# Altium footprint library Cty1.PcbLib: 1378 footprints (part 84 of 87)
Each footprint in its own frame and in the unit in brackets; x right, y up, seen from the top. Pads: shape width x height; smd on the part's side, far side on the other; paste and mask are expansions set on the pad; w line width, h text height; cw(c..) or ccw(c..) is an arc to the next point about the centre after c.
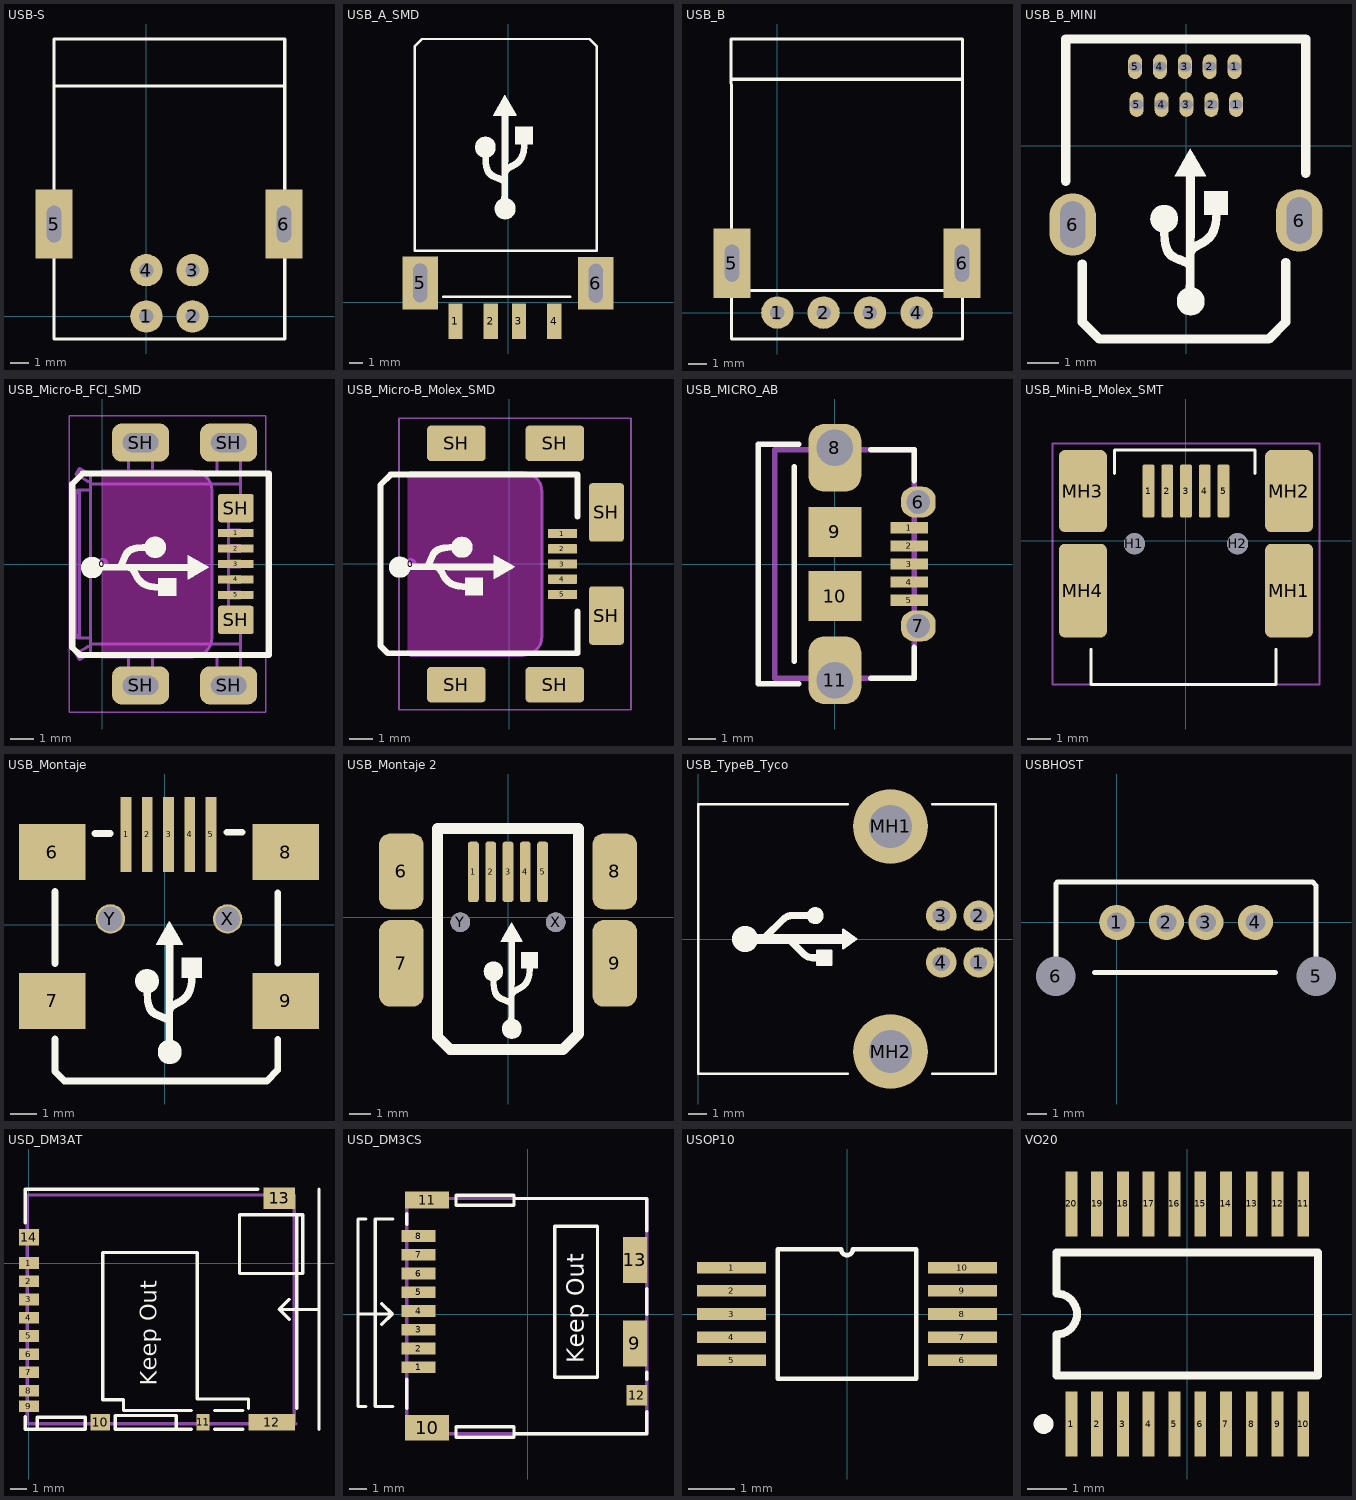
[diagram p83: the footprints below, top view; thin cyan lines are the x and y axes]

## USB-S [mil] "USB B connector, 4pin, For Print"
height 100
pads (6):
  round 70 hole 31: 1(0,0) 2(100,0) 3(100,100) 4(0,100)
  rect 80x150 hole 31 slot 80 at 90 deg: 5(-200,200) 6(298,200)
Top Overlay:
  lines w7: -200,499 300,499 ; -200,-49 -200,601 300,601 300,-49 -200,-49
3D body "usb_a-usbsb.stp": height 421.26, standoff -155.51, extent -243.31,-39.61 343.31,610

## USB_A_SMD [mil] "For USB SMD"
height 150
pads (6):
  rect 40x100 smd: 1(-149,-54.5) 2(-49,-54.5) 3(31,-54.5) 4(131,-54.5)
  rect 100x150 hole 40 slot 110 at 90 deg: 5(-249,54.5) 6(249,53.5)
Top Overlay:
  drawing of 1147 lines, arcs and shapes, not listed
3D body "SW3dPS-USB Series A Plug.STEP": height 73.83, standoff -103.33, extent -242.44,7.67 230,729.33

## USB_B [mil] "USB A connector, 4pin, For USB sing"
height 100
pads (6):
  round 70 hole 31: 1(0,0) 2(100,0) 3(200,0) 4(301,0)
  rect 80x150 hole 31 slot 80 at 90 deg: 5(-98,107) 6(399,107)
Top Overlay:
  lines w7: -99,504 400,504 ; -98,48 401,48 ; -100,591 400,591 400,-57 -99,-57 -99,397 -100,591
3D body "usb_a-usbsa.stp": height 277.51, standoff -149.84, extent -162.02,-58 460.02,512.87

## USB_B_MINI [mm]
pads (12):
  oval 0.45x0.8 hole 0.3 slot 0.4 at 0 deg: 1(1.562,2.54) 1(1.613,1.321) 2(0.762,2.54) 2(0.813,1.321) 3(-0.038,2.54) 3(0.013,1.321) 4(-0.838,2.54) 4(-0.787,1.321) 5(-1.638,2.54) 5(-1.587,1.321)
  oval 1.5x2 hole 0.8 slot 1.5 at 90 deg: 6(-3.645,-2.54) 6(3.645,-2.413)
Top Overlay:
  drawing of 1148 lines, arcs and shapes, not listed
3D body "usb_b_mini_dip.stp": height 3.92, standoff -1.68, extent -3.873,-6.251 3.828,3.101

## USB_Micro-B_FCI_SMD [mm]
height 2.286
pads (12):
  round 0.508 on Mech15: 0(0,0)
  rrect20% 1.5x0.35 smd: 1(5.6,1.3) 2(5.6,0.65) 3(5.6,0) 4(5.6,-0.65) 5(5.6,-1.3)
  rrect50% 2.4x1.6 hole 0.8 slot 1.5 at 0 deg: SH(1.6,-5.1) SH(1.6,5.1) SH(5.3,-5.1) SH(5.3,5.1)
  rrect20% 1.5x1.2 smd: SH(5.6,-2.35) SH(5.6,2.35)
Top Overlay:
  drawing of 1147 lines, arcs and shapes, not listed
Top Solder:
  rectangle: 4.826,-1.905 6.35,1.905
Keep-Out Layer:
  board cut-out: 0,3.9 3.797,3.9 3.875,3.9 4.03,3.869 4.175,3.809 4.307,3.721 4.418,3.61 4.505,3.479 4.566,3.333 4.597,3.179 4.597,3.1 4.597,-3.1 4.597,-3.179 4.566,-3.333 4.505,-3.479 4.418,-3.61 4.307,-3.721 4.175,-3.809 4.03,-3.869 3.875,-3.9 3.797,-3.9 0,-3.9
Mechanical 13:
  lines w0.127: -1.031,-3.71 -0.881,-3.97 ; -1.031,3.71 -0.881,3.97 ; -0.881,-3.1 cw(c-0.874,-3.006) -0.968,-3 ; -0.881,3.1 ccw(c-0.874,3.006) -0.968,3 ; -0.5,-3.45 ccw(c-0.501,-3.75) -0.651,-3.49 -1.118,-3.76 -0.968,-4.02 -0.5,-3.75 ; -0.5,-3.35 5.8,-3.35 ; -0.5,3.35 5.8,3.35 ; -0.5,3.45 cw(c-0.501,3.75) -0.651,3.49 -1.118,3.76 -0.968,4.02 -0.5,3.75 ; 1.1,-4.85 2.1,-4.85 ; 1.1,-3.85 2.1,-3.85 ; 1.1,-3.75 1.1,-5.25 2.1,-5.25 2.1,-3.75 ; 1.1,3.75 1.1,5.25 2.1,5.25 2.1,3.75 ; 1.1,3.85 2.1,3.85 ; 1.1,4.85 2.1,4.85 ; 4.8,-4.85 5.8,-4.85 ; 4.8,-3.85 5.8,-3.85 ; 4.8,-3.75 4.8,-5.25 5.8,-5.25 5.8,-2.577 ccw(c5.6,-2.577) 5.748,-2.443 5.352,-2.007 cw(c5.5,-1.873) 5.3,-1.873 5.3,1.873 cw(c5.5,1.873) 5.352,2.007 5.748,2.443 ccw(c5.6,2.577) 5.8,2.577 5.8,5.25 4.8,5.25 4.8,3.75 ; 4.8,3.85 5.8,3.85 ; 4.8,4.85 5.8,4.85 ; 5.3,-1.825 5.8,-1.825 5.8,-2.024 ccw(c5.8,-2.275) 5.553,-2.229 ; 5.3,-1.425 5.8,-1.425 5.8,-1.175 5.3,-1.175 ; 5.3,-0.775 5.8,-0.775 5.8,-0.525 5.3,-0.525 ; 5.3,-0.125 5.8,-0.125 5.8,0.125 5.3,0.125 ; 5.3,0.525 5.8,0.525 5.8,0.775 5.3,0.775 ; 5.3,1.175 5.8,1.175 5.8,1.425 5.3,1.425 ; 5.3,1.825 5.8,1.825 5.8,2.024 cw(c5.8,2.275) 5.553,2.229 ; 5.793,-2.526 5.8,-2.526 ; 5.793,2.526 5.8,2.526 ; 5.8,-3.75 -0.5,-3.75 ; 5.8,3.75 -0.5,3.75 ; -1.118,-3 ccw(c-1.024,-3.006) -1.031,-3.1 -0.5,-3.1 ; -1.118,-3 -0.968,-3 ; -1.118,-3 -1.118,3 ; -1.118,3 cw(c-1.024,3.006) -1.031,3.1 -0.5,3.1 ; -1.118,3 -0.968,3 ; -0.968,-3 -0.968,3 ; -0.5,-3.75 -0.5,-3.1 ; -0.501,-3.1 -0.5,3.1 ; -0.5,3.1 -0.5,3.75
Mechanical 15:
  lines w0.076: -1.397,-6.223 -1.397,6.223 6.858,6.223 6.858,-6.223 -1.397,-6.223
  lines w0.127: 0,-3.9 3.797,-3.9 ccw(c3.797,-3.1) 4.597,-3.1 4.597,3.1 ccw(c3.797,3.1) 3.797,3.9 0,3.9
3D body "USB Micro B plug.STEP": height 4.67, standoff -3.53, extent -21.579,-5.35 2.921,5.35
3D body "Micro USB B-type mid-mount FCI.STEP": height 2.15, standoff -0.92, extent -1.118,-5.25 5.8,5.25

## USB_Micro-B_Molex_SMD [mm]
height 1.2
pads (12):
  round 0.508 on Mech15: 0(-4.201,-0.013)
  rrect20% 1.25x0.4 smd: 1(2.274,1.287) 2(2.274,0.637) 3(2.274,-0.013) 4(2.274,-0.663) 5(2.274,-1.313)
  rrect20% 2.5x1.5 smd: SH(-2.251,-5.163) SH(-2.251,5.137) SH(1.949,-5.163) SH(1.949,5.137)
  rrect20% 1.5x2.5 smd: SH(4.149,-2.213) SH(4.149,2.187)
Top Overlay:
  drawing of 1147 lines, arcs and shapes, not listed
Top Solder:
  rectangle: 1.641,-1.283 2.911,1.257
Keep-Out Layer:
  board cut-out: -4.328,3.887 0.599,3.887 0.678,3.887 0.832,3.857 0.978,3.796 1.109,3.709 1.22,3.597 1.308,3.466 1.368,3.321 1.399,3.166 1.399,3.087 1.399,-3.113 1.399,-3.191 1.368,-3.346 1.308,-3.492 1.22,-3.623 1.109,-3.734 0.978,-3.822 0.832,-3.882 0.678,-3.913 0.599,-3.913 -4.328,-3.913
Mechanical 13:
  lines w0.127: -4.201,-3.913 0.599,-3.913 ccw(c0.599,-3.113) 1.399,-3.113 1.399,3.087 ccw(c0.599,3.087) 0.599,3.887 -4.201,3.887
Mechanical 15:
  lines w0.076: -4.701,-6.236 -4.701,6.21 5.197,6.21 5.197,-6.236 -4.701,-6.236
3D body "USB Micro B plug.STEP": height 4.1, standoff -4.1, extent -25.209,-5.363 -0.709,5.337
3D body "Micro USB B Receptacle Middle Mount.STEP": height 1.43, standoff -1.52, extent -4.631,-5.513 4.499,5.487

## USB_MICRO_AB [mm] "Creator MM"
height 3
pads (11):
  rect 1.35x0.4 smd mask+0.025: 1(2.675,1.3) 2(2.675,0.65) 3(2.675,0) 4(2.675,-0.65) 5(2.675,-1.3)
  rrect84% 1.25x1.1 hole 0.85 mask+0.04: 6(3,2.225) 7(3,-2.225)
  rrect60% 1.9x2.425 hole 1.3 copper offset 0,-0.363: 8(0,4.175)
  rect 1.9x1.8 smd paste-10: 9(0,1.15) 10(0,-1.15)
  rrect60% 1.9x2.425 hole 1.3 copper offset 0,0.363: 11(0,-4.175)
Top Overlay:
  lines w0.2: -1.45,-3.5 -1.45,3.5 ; -1.3,-4.3 -2.75,-4.3 -2.75,4.3 -1.3,4.3 ; 1.3,-4.1 2.85,-4.1 2.85,-3 ; 1.3,4.1 2.85,4.1 2.85,3
Mechanical 16:
  lines w0.2: -2.15,-4.1 2.85,-4.1 2.85,4.1 -2.15,4.1 -2.15,-4.1
Mechanical 29:
  text ".Designator" at 1.2,-1.9 h1.52
3D body "475890001.stp": height 2.76, standoff -0.58, extent -2.75,-4.325 3.045,4.325

## USB_Mini-B_Molex_SMT [mm]
height 3.95
pads (11):
  rrect25% 0.5x2.25 smd: 1(-1.6,2.125) 2(-0.8,2.125) 3(0,2.125) 4(0.8,2.125) 5(1.6,2.125)
  round 0.9 hole 0.9 unplated: H1(-2.2,-0.125) H2(2.2,-0.125)
  rrect25% 2.05x4 smd: MH1(4.4,-2.125) MH4(-4.4,-2.125)
  rrect25% 2.05x3.5 smd: MH2(4.4,2.125) MH3(-4.4,2.125)
Top Overlay:
  lines w0.127: -4.05,-4.625 -4.05,-6.125 3.85,-6.125 3.85,-4.625 ; -3.05,2.875 -3.05,3.875 2.95,3.875 2.95,2.875
Mechanical 15:
  lines w0.076: -5.7,-6.125 -5.7,4.15 5.7,4.15 5.7,-6.125 -5.7,-6.125
3D body "usb_mini_smd.STEP": height 4.15, standoff -0.94, extent -4.953,-5.998 4.947,3.202

## USB_Montaje [mm] "Conector USB de montaje superficial"
pads (11):
  rect 0.4x2.8 smd: 1(-1.46,3.39) 2(-0.664,3.39) 3(0.132,3.39) 4(0.929,3.39) 5(1.725,3.39)
  rect 2.5x2.1 smd: 6(-4.225,2.725) 7(-4.225,-2.85) 8(4.525,2.725) 9(4.525,-2.85)
  round 1.1 hole 0.93: X(2.35,0.225) Y(-2.05,0.225)
Top Overlay:
  drawing of 1149 lines, arcs and shapes, not listed
3D body "USB_mini_B.STEP": height 3.95, standoff -1, extent -5.2,-5.65 5.5,3.55

## USB_Montaje 2 [mm] "Conector USB de montaje superficial"
pads (11):
  rrect50% 0.5x2.8 smd: 1(-1.6,2.1) 2(-0.8,2.1) 3(0,2.1) 4(0.8,2.1) 5(1.6,2.1)
  rrect50% 2.05x3.5 smd: 6(-4.925,2.125) 8(4.925,2.125)
  rrect50% 2.05x4 smd: 7(-4.925,-2.125) 9(4.925,-2.125)
  round 0.9 hole 0.9 unplated: X(2.2,-0.225) Y(-2.2,-0.225)
Top Overlay:
  drawing of 1147 lines, arcs and shapes, not listed
3D body "USB Mini B - Connector.stp": height 3.95, standoff -1, extent -4.943,-6.117 4.957,2.883

## USB_TypeB_Tyco [mm]
height 11.1
pads (6):
  round 1.626 hole 0.914: 1(14.99,-1.25) 2(14.99,1.25) 3(12.99,1.25) 4(12.99,-1.25)
  round 4 hole 2.3: MH1(10.28,6.02) MH2(10.28,-6.02)
Top Overlay:
  circle w0.508: c6.25,1.25 r0.2
  circle w0.889: c2.5,0 r0.254
  region: 7.1,-1.375 6.35,-1.375 6.35,-0.625 7.1,-0.625
  region: 8.45,0 7.75,-0.5 7.75,0.5
  lines w0.127: 8,-7.2 0,-7.2 0,7.2 8,7.2 ; 12.5,-7.2 15.9,-7.2 15.9,7.2 12.5,7.2 ; 6.35,-1.375 7.1,-1.375 7.1,-0.625 6.35,-0.625 6.35,-1.375 ; 7.75,-0.5 7.75,0.5 8.45,0 7.75,-0.5
  lines w0.381: 3.547,0.062 4.547,1.062 cw(c5,0.61) 5,1.25 6.25,1.25 ; 4.897,-0.062 5.647,-0.812 ccw(c6.1,-0.36) 6.1,-1 6.35,-1
  lines w0.508: 3,0 7.75,0
3D body "c-0292304-01-b-3d.stp": height 11.5, standoff -3.93, extent 0,-7.194 15.7,7.194

## USBHOST [mil]
pads (6):
  round 70 hole 39.37 unplated: 1(0,0) 2(98.6,0) 3(177.1,0) 4(275.6,0)
  round 70 hole 78.74 unplated: 5(396.6,-107) 6(-121.4,-107)
Top Overlay:
  lines w10: -121.4,-107 -121.4,77 -118.4,80 389.6,80 396.6,73 396.6,-107 ; -44.4,-100 315.6,-100

## USD_DM3AT [mm] "MM added 3D model & assembly layer."
pads (14):
  rect 1.2x0.7 smd: 1(0,0) 2(0,-1.1) 3(0,-2.2) 4(0,-3.3) 5(0,-4.4) 6(0,-5.5) 7(0,-6.6)
  rect 1.2x0.7 smd mask+0.07: 8(0,-7.7) 9(0,-8.65)
  rect 1.2x1 smd: 10(4.3,-9.6) 14(0,1.55)
  rect 0.8x1 smd: 11(10.5,-9.6)
  rect 2.8x1 smd: 12(14.65,-9.6)
  rect 1.9x1.3 smd: 13(15.1,3.9)
Top Overlay:
  lines w0.2: -0.231,-9.271 -0.231,-10.033 3.4,-10.033 ; -0.231,2.413 -0.231,4.445 13.8,4.445 ; 0.5,-10.033 0.5,-9.3 3.4,-9.3 3.4,-10.004 ; 8.89,-10.033 8.89,-9.21 8.89,-9.2 5.2,-9.2 5.2,-10.033 9.8,-10.033 ; 9.8,-8.9 5.7,-8.9 5.7,-8.255 4.445,-8.255 4.445,0.635 10.16,0.635 10.16,-8.2 13.245,-8.2 13.245,-8.755 ; 11.2,-10.033 12.9,-10.033 ; 11.2,-8.9 12.9,-8.9 ; 15.7,-3.4 15.1,-2.8 ; 15.7,-2.2 15.1,-2.8 ; 16.152,-8.763 16.152,2.921 ; 17.45,-2.8 15.1,-2.8 ; 17.495,-10.033 17.495,4.445 ; 12.7,-0.635 16.51,-0.635 16.51,2.921 12.7,2.921 12.7,-0.635
  text "Keep Out" at 7.7,-7.4 h1
Mechanical 16:
  lines w0.2: -0.1,-9.7 16.1,-9.7 16,-9.6 16,4.1 -0.1,4.1 -0.1,-9.7
Mechanical 29:
  text ".Designator" at 8.5,-4.8 h1.52
3D body "DM3AT-SF-PEJM5.stp": height 1.68, standoff 0, extent -0.1,-9.7 16.05,4.15

## USD_DM3CS [mm] "Creator MM"
height 1.83
pads (13):
  rect 2x0.7 smd: 1(-6.4,-3.125) 2(-6.4,-2.025) 3(-6.4,-0.925) 4(-6.4,0.175) 5(-6.4,1.275) 6(-6.4,2.375) 7(-6.4,3.475) 8(-6.4,4.575)
  rect 1.4x2.7 smd: 9(6.3,-1.725) 13(6.3,3.175)
  rect 2.6x1.5 smd: 10(-5.9,-6.675)
  rect 2.6x1 smd: 11(-5.9,6.675)
  rect 1.2x1.2 smd: 12(6.4,-4.775)
Top Overlay:
  lines w0.2: -9.95,0 -7.95,0 ; -9.5,-5.425 -9.95,-5.425 -9.95,5.575 -9.5,5.575 ; -8.55,-0.6 -7.95,0 ; -8.55,0.6 -7.95,0 ; -7.9,-5.425 -8.95,-5.425 -8.95,5.575 -7.9,5.575 ; -7.1,-5.525 -7.1,-3.825 ; -7.1,5.275 -7.1,5.875 ; -0.8,-7.025 7,-7.025 7,-5.725 ; -0.8,6.775 7,6.775 7,4.875 ; 7,-3.825 7,-3.425 ; 7,-0.025 7,1.475 ; -4.2,-7.225 -4.2,-6.625 -0.8,-6.625 -0.8,-7.225 -4.2,-7.225 ; -4.2,6.375 -0.8,6.375 -0.8,6.975 -4.2,6.975 -4.2,6.375 ; 1.6,-3.7 1.6,5.15 4.1,5.15 4.1,-3.7 1.6,-3.7
  text "Keep Out" at 3.3,-2.9 h1
Mechanical 16:
  lines w0.2: -7.1,-7.025 -7.1,6.775 7,6.775 7,-7.025 -7.1,-7.025
Mechanical 29:
  text ".Designator" at -0.2,-2 h1.52
3D body "DM3CS-SF.stp": height 1.98, standoff 0.05, extent -7.1,-7.025 7,6.775

## USOP10 [mm]
pads (10):
  rect 1.5x0.25 smd: 1(-2.5,1) 2(-2.5,0.5) 3(-2.5,0) 4(-2.5,-0.5) 5(-2.5,-1) 6(2.5,-1) 7(2.5,-0.5) 8(2.5,0) 9(2.5,0.5) 10(2.5,1)
Top Overlay:
  lines w0.1: -0.15,1.4 -1.5,1.4 -1.5,-1.4 1.5,-1.4 1.5,1.4 0.15,1.4 ; -0.125,1.4 ccw(c0,1.4) 0.125,1.4

## VO20 [mm] "20-Lead TSOP (VO20)"
height 1.2
pads (20):
  rect 0.3x1.65 smd: 1(-2.925,-2.775) 2(-2.275,-2.775) 3(-1.625,-2.775) 4(-0.975,-2.775) 5(-0.325,-2.775) 6(0.325,-2.775) 7(0.975,-2.775) 8(1.625,-2.775) 9(2.275,-2.775) 10(2.925,-2.775) 11(2.925,2.775) 12(2.275,2.775) 13(1.625,2.775) 14(0.975,2.775) 15(0.325,2.775) 16(-0.325,2.775) 17(-0.975,2.775) 18(-1.625,2.775) 19(-2.275,2.775) 20(-2.925,2.775)
Top Overlay:
  circle w0.25: c-3.625,-2.775 r0.125
  lines w0.2: -3.3,-1.55 3.3,-1.55 3.3,1.55 -3.3,1.55 -3.3,0.517 cw(c-3.3,0) -3.3,-0.517 -3.3,-1.55